# Altium footprint library Conectors.PcbLib: 123 footprints (part 6 of 8)
Each footprint in its own frame and in the unit in brackets; x right, y up, seen from the top. Pads: shape width x height; smd on the part's side, far side on the other; paste and mask are expansions set on the pad; w line width, h text height; cw(c..) or ccw(c..) is an arc to the next point about the centre after c.
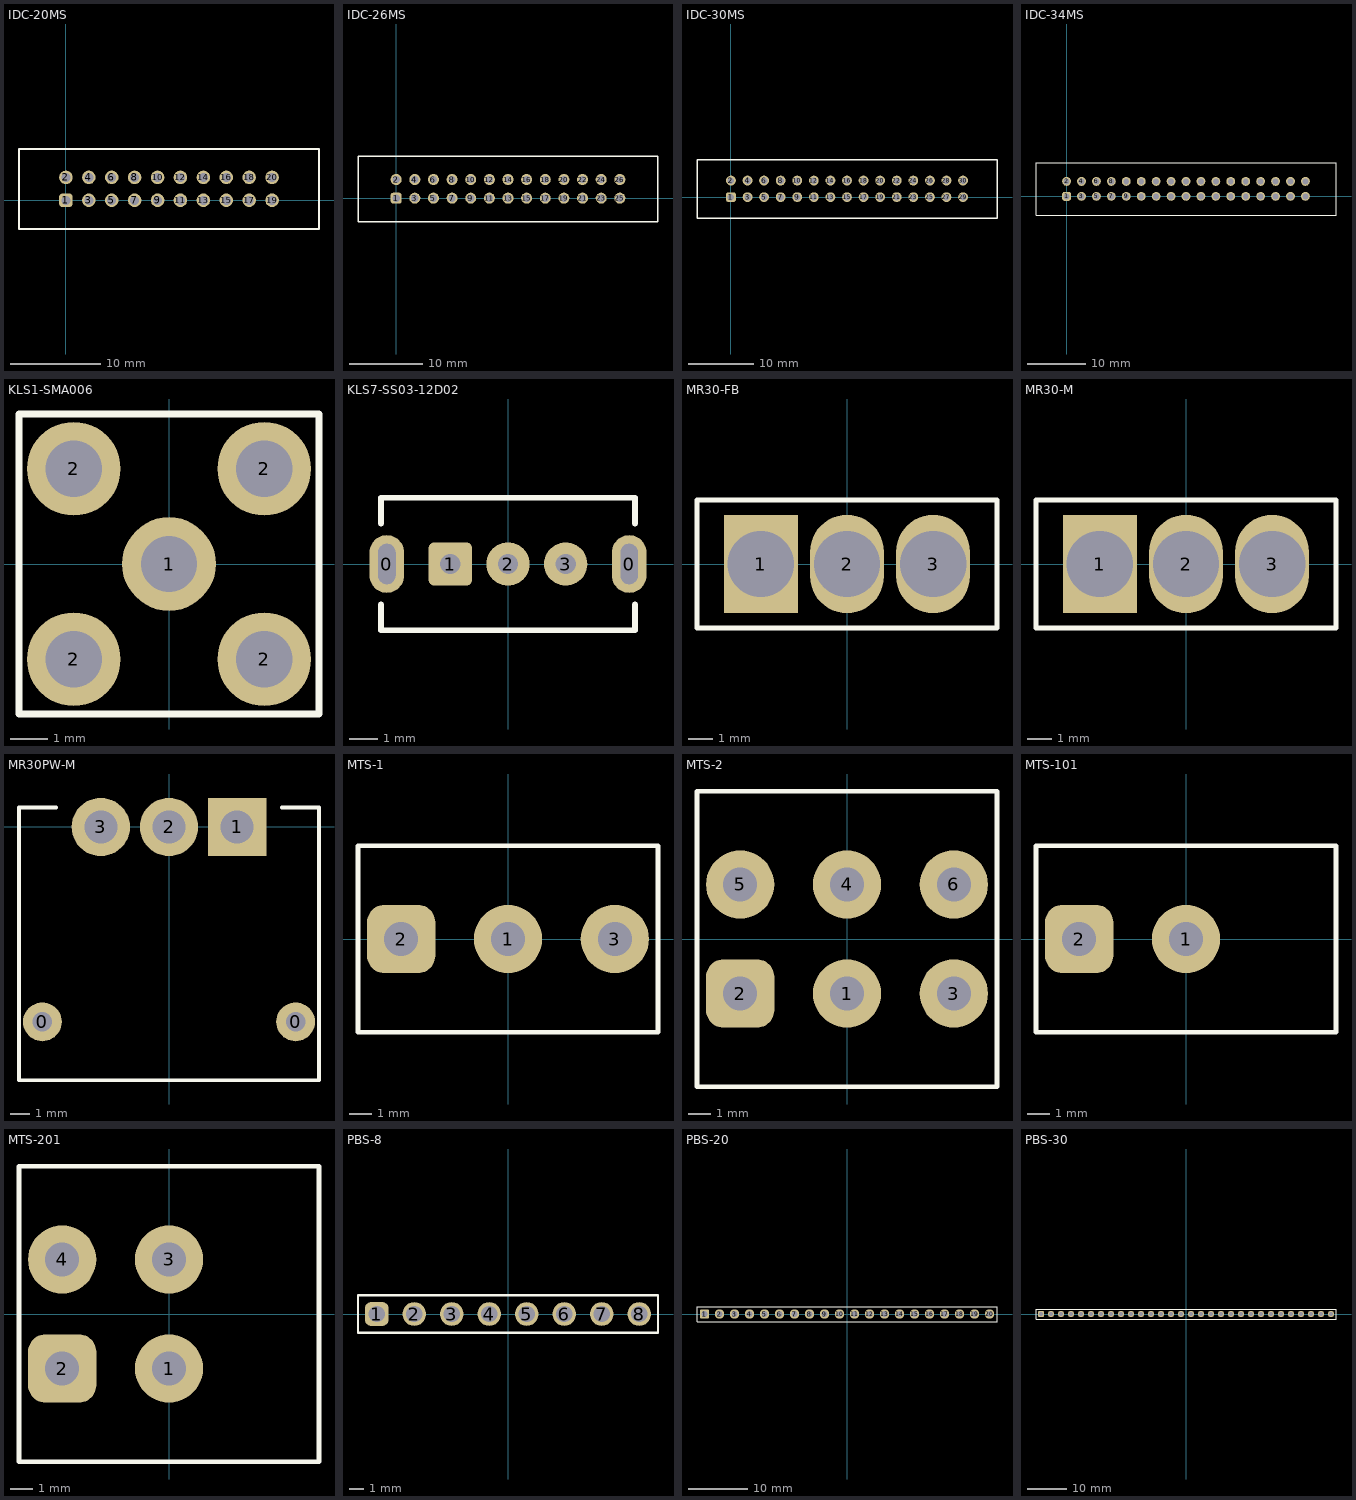
[diagram p5: the footprints below, top view; thin cyan lines are the x and y axes]

## IDC-20MS [mm]
pads (20):
  rrect50% 1.5x1.5 hole 1: 1(0,0)
  round 1.5 hole 1: 2(0,2.54) 3(2.54,0) 4(2.54,2.54) 5(5.08,0) 6(5.08,2.54) 7(7.62,0) 8(7.62,2.54) 9(10.16,0) 10(10.16,2.54) 11(12.7,0) 12(12.7,2.54) 13(15.24,0) 14(15.24,2.54) 15(17.78,0) 16(17.78,2.54) 17(20.32,0) 18(20.32,2.54) 19(22.86,0) 20(22.86,2.54)
Top Overlay:
  lines w0.2: -5.2,-3.2 28.06,-3.2 28.06,5.7 -5.2,5.7 -5.2,-3.2
3D body "DS1013-20S (IDC-20MS CONNFLY).stp": height 9, standoff -3.6, extent -5.17,-3.23 28.03,5.67

## IDC-26MS [mm]
pads (26):
  rrect50% 1.5x1.5 hole 1: 1(0,0)
  round 1.5 hole 1: 2(0,2.54) 3(2.54,0) 4(2.54,2.54) 5(5.08,0) 6(5.08,2.54) 7(7.62,0) 8(7.62,2.54) 9(10.16,0) 10(10.16,2.54) 11(12.7,0) 12(12.7,2.54) 13(15.24,0) 14(15.24,2.54) 15(17.78,0) 16(17.78,2.54) 17(20.32,0) 18(20.32,2.54) 19(22.86,0) 20(22.86,2.54) 21(25.4,0) 22(25.4,2.54) 23(27.94,0) 24(27.94,2.54) 25(30.48,0) 26(30.48,2.54)
Top Overlay:
  lines w0.2: -5.2,-3.2 -5.2,5.7 35.68,5.7 35.68,-3.2 -5.2,-3.2
3D body "DS1013-26S (IDC-26MS CONNFLY).stp": height 9, standoff -3.6, extent -5.17,-3.23 35.65,5.67

## IDC-30MS [mm]
pads (30):
  rrect50% 1.5x1.5 hole 1: 1(0,0)
  round 1.5 hole 1: 2(0,2.54) 3(2.54,0) 4(2.54,2.54) 5(5.08,0) 6(5.08,2.54) 7(7.62,0) 8(7.62,2.54) 9(10.16,0) 10(10.16,2.54) 11(12.7,0) 12(12.7,2.54) 13(15.24,0) 14(15.24,2.54) 15(17.78,0) 16(17.78,2.54) 17(20.32,0) 18(20.32,2.54) 19(22.86,0) 20(22.86,2.54) 21(25.4,0) 22(25.4,2.54) 23(27.94,0) 24(27.94,2.54) 25(30.48,0) 26(30.48,2.54) 27(33.02,0) 28(33.02,2.54) 29(35.56,0) 30(35.56,2.54)
Top Overlay:
  lines w0.2: -5.2,-3.2 40.76,-3.2 40.76,5.7 -5.2,5.7 -5.2,-3.2
3D body "DS1013-30S (IDC-30MS CONNFLY).step": height 9, standoff -3.6, extent -5.17,-3.23 40.73,5.67

## IDC-34MS [mm]
pads (34):
  rrect50% 1.5x1.5 hole 1: 1(0,0)
  round 1.5 hole 1: 2(0,2.54) 3(2.54,0) 4(2.54,2.54) 5(5.08,0) 6(5.08,2.54) 7(7.62,0) 8(7.62,2.54) 9(10.16,0) 10(10.16,2.54) 11(12.7,0) 12(12.7,2.54) 13(15.24,0) 14(15.24,2.54) 15(17.78,0) 16(17.78,2.54) 17(20.32,0) 18(20.32,2.54) 19(22.86,0) 20(22.86,2.54) 21(25.4,0) 22(25.4,2.54) 23(27.94,0) 24(27.94,2.54) 25(30.48,0) 26(30.48,2.54) 27(33.02,0) 28(33.02,2.54) 29(35.56,0) 30(35.56,2.54) 31(38.1,0) 32(38.1,2.54) 33(40.64,0) 34(40.64,2.54)
Top Overlay:
  lines w0.2: -5.2,-3.2 -5.2,5.7 45.84,5.7 45.84,-3.2 -5.2,-3.2
3D body "DS1013-34S (IDC-34MS CONNFLY).step": height 9, standoff -3.6, extent -5.17,-3.23 45.81,5.67

## KLS1-SMA006 [mm]
pads (5):
  round 2.5 hole 1.5: 1(0,0) 2(-2.54,-2.54) 2(-2.54,2.54) 2(2.54,-2.54) 2(2.54,2.54)
Top Overlay:
  lines w0.2: -4,-4 4,-4 4,4 -4,4 -4,-4
3D body "KLS1-SMA006.STEP": height 10.5, standoff -3, extent -3.5,-13.5 3.5,3.5

## KLS7-SS03-12D02 [mm]
pads (5):
  oval 1.2x2 hole 0.6 slot 1.4 at 90 deg: 0(-4.2,0) 0(4.2,0)
  rrect25% 1.5x1.5 hole 0.7: 1(-2,0)
  round 1.5 hole 0.7: 2(0,0) 3(2,0)
Top Overlay:
  lines w0.2: -4.4,-1.4 -4.4,-2.3 4.4,-2.3 4.4,-1.4 ; -4.4,1.4 -4.4,2.3 4.4,2.3 4.4,1.4
3D body "User Library-KLS7-SS03-12D02-EG-3.step": height 7.33, standoff -2.8, extent -4.35,-2.25 4.35,2.25

## MR30-FB [mm]
pads (3):
  rect 3x4 hole 2.7: 1(-3.5,0)
  oval 3x4 hole 2.7: 2(0,0) 3(3.5,0)
Top Overlay:
  lines w0.2: -6.1,-2.6 -6.1,2.6 6.1,2.6 6.1,-2.6 -6.1,-2.6
3D body "Amass MR30-FB.STEP": height 9.5, standoff -3, extent -6.1,-2.6 6.1,2.6

## MR30-M [mm]
pads (3):
  rect 3x4 hole 2.7: 1(-3.5,0)
  oval 3x4 hole 2.7: 2(0,0) 3(3.5,0)
Top Overlay:
  lines w0.2: -6.1,-2.6 -6.1,2.6 6.1,2.6 6.1,-2.6 -6.1,-2.6
3D body "Amass MR30-M.STEP": height 10.5, standoff -3, extent -6.05,-2.55 6.05,2.55

## MR30PW-M [mm]
pads (5):
  round 2 hole 1: 0(-6.5,-10) 0(6.5,-10)
  rect 3x3 hole 1.7: 1(3.5,0)
  round 3 hole 1.7: 2(0,0) 3(-3.5,0)
Top Overlay:
  lines w0.2: -5.8,1 -7.7,1 -7.7,-13 7.7,-13 7.7,1 5.8,1
3D body "MR30PW-M v2.step": height 5.05, standoff -1.95, extent -7.7,-13 7.7,0.95

## MTS-1 [mm]
pads (3):
  round 3 hole 1.5: 1(0,0) 3(4.7,0)
  rrect50% 3x3 hole 1.5: 2(-4.7,0)
Top Overlay:
  lines w0.2: -6.6,-4.103 -6.6,4.1 6.6,4.103 6.6,-4.1 -6.6,-4.103
3D body "MTS-1xx-A2-blue.step": height 30.13, standoff -5.5, extent -6.792,-5.999 6.6,5.999

## MTS-2 [mm]
pads (6):
  round 3 hole 1.5: 1(0,-2.4) 3(4.7,-2.4) 4(0,2.4) 5(-4.7,2.4) 6(4.7,2.4)
  rrect50% 3x3 hole 1.5: 2(-4.7,-2.4)
Top Overlay:
  lines w0.2: -6.6,-6.503 -6.6,6.5 6.6,6.503 6.6,-6.5 -6.6,-6.503
3D body "ToggleSwitch 6Pin.stp": height 29.31, standoff -3.5, extent -8,-6.4 6.55,6.4

## MTS-101 [mm]
pads (2):
  round 3 hole 1.5: 1(0,0)
  rrect50% 3x3 hole 1.5: 2(-4.7,0)
Top Overlay:
  lines w0.2: -6.6,-4.103 -6.6,4.1 6.6,4.103 6.6,-4.1 -6.6,-4.103
3D body "MTS-1xx-A2-blue.step": height 30.13, standoff -5.5, extent -6.792,-5.999 6.6,5.999

## MTS-201 [mm]
pads (4):
  round 3 hole 1.5: 1(0,-2.4) 3(0,2.4) 4(-4.7,2.4)
  rrect50% 3x3 hole 1.5: 2(-4.7,-2.4)
Top Overlay:
  lines w0.2: -6.6,-6.503 6.6,-6.5 6.6,6.503 -6.6,6.5 -6.6,-6.503
3D body "ToggleSwitch 6Pin.stp": height 29.31, standoff -3.5, extent -8,-6.4 6.55,6.4

## PBS-8 [mm]
pads (8):
  rrect50% 1.6x1.6 hole 1.1: 1(-8.89,0)
  round 1.6 hole 1.1: 2(-6.35,0) 3(-3.81,0) 4(-1.27,0) 5(1.27,0) 6(3.81,0) 7(6.35,0) 8(8.89,0)
Top Overlay:
  lines w0.15: -10.16,-1.27 -10.16,1.27 0,1.27 10.16,1.27 10.16,-1.27 0,-1.27 -10.16,-1.27
3D body "User Library-DS1023.STEP": height 8.5, standoff -3, extent -10.16,-1.27 -7.62,1.27
3D body "User Library-DS1023.STEP": height 8.5, standoff -3, extent -7.62,-1.27 -5.08,1.27
3D body "User Library-DS1023.STEP": height 8.5, standoff -3, extent -5.08,-1.27 -2.54,1.27
3D body "User Library-DS1023.STEP": height 8.5, standoff -3, extent -2.54,-1.27 0,1.27
3D body "User Library-DS1023.STEP": height 8.5, standoff -3, extent 0,-1.27 2.54,1.27
3D body "User Library-DS1023.STEP": height 8.5, standoff -3, extent 2.54,-1.27 5.08,1.27
3D body "User Library-DS1023.STEP": height 8.5, standoff -3, extent 5.08,-1.27 7.62,1.27
3D body "User Library-DS1023.STEP": height 8.5, standoff -3, extent 7.62,-1.27 10.16,1.27

## PBS-20 [mm]
pads (20):
  rrect50% 1.6x1.6 hole 1.1: 1(-24.13,0)
  round 1.6 hole 1.1: 2(-21.59,0) 3(-19.05,0) 4(-16.51,0) 5(-13.97,0) 6(-11.43,0) 7(-8.89,0) 8(-6.35,0) 9(-3.81,0) 10(-1.27,0) 11(1.27,0) 12(3.81,0) 13(6.35,0) 14(8.89,0) 15(11.43,0) 16(13.97,0) 17(16.51,0) 18(19.05,0) 19(21.59,0) 20(24.13,0)
Top Overlay:
  lines w0.15: -25.4,-1.27 25.4,-1.27 25.4,1.27 -25.4,1.27 -25.4,-1.27
3D body "User Library-DS1023.STEP": height 8.5, standoff -3, extent -7.62,-1.27 -5.08,1.27
3D body "User Library-DS1023.STEP": height 8.5, standoff -3, extent -10.16,-1.27 -7.62,1.27
3D body "User Library-DS1023.STEP": height 8.5, standoff -3, extent -12.7,-1.27 -10.16,1.27
3D body "User Library-DS1023.STEP": height 8.5, standoff -3, extent -15.24,-1.27 -12.7,1.27
3D body "User Library-DS1023.STEP": height 8.5, standoff -3, extent -17.78,-1.27 -15.24,1.27
3D body "User Library-DS1023.STEP": height 8.5, standoff -3, extent -20.32,-1.27 -17.78,1.27
3D body "User Library-DS1023.STEP": height 8.5, standoff -3, extent -22.86,-1.27 -20.32,1.27
3D body "User Library-DS1023.STEP": height 8.5, standoff -3, extent -25.4,-1.27 -22.86,1.27
3D body "User Library-DS1023.STEP": height 8.5, standoff -3, extent -2.54,-1.27 0,1.27
3D body "User Library-DS1023.STEP": height 8.5, standoff -3, extent -5.08,-1.27 -2.54,1.27
3D body "User Library-DS1023.STEP": height 8.5, standoff -3, extent 5.08,-1.27 7.62,1.27
3D body "User Library-DS1023.STEP": height 8.5, standoff -3, extent 7.62,-1.27 10.16,1.27
3D body "User Library-DS1023.STEP": height 8.5, standoff -3, extent 10.16,-1.27 12.7,1.27
3D body "User Library-DS1023.STEP": height 8.5, standoff -3, extent 12.7,-1.27 15.24,1.27
3D body "User Library-DS1023.STEP": height 8.5, standoff -3, extent 15.24,-1.27 17.78,1.27
3D body "User Library-DS1023.STEP": height 8.5, standoff -3, extent 17.78,-1.27 20.32,1.27
3D body "User Library-DS1023.STEP": height 8.5, standoff -3, extent 20.32,-1.27 22.86,1.27
3D body "User Library-DS1023.STEP": height 8.5, standoff -3, extent 22.86,-1.27 25.4,1.27
3D body "User Library-DS1023.STEP": height 8.5, standoff -3, extent 0,-1.27 2.54,1.27
3D body "User Library-DS1023.STEP": height 8.5, standoff -3, extent 2.54,-1.27 5.08,1.27

## PBS-30 [mm]
pads (30):
  rrect50% 1.6x1.6 hole 1.1: 1(-36.83,0)
  round 1.6 hole 1.1: 2(-34.29,0) 3(-31.75,0) 4(-29.21,0) 5(-26.67,0) 6(-24.13,0) 7(-21.59,0) 8(-19.05,0) 9(-16.51,0) 10(-13.97,0) 11(-11.43,0) 12(-8.89,0) 13(-6.35,0) 14(-3.81,0) 15(-1.27,0) 16(1.27,0) 17(3.81,0) 18(6.35,0) 19(8.89,0) 20(11.43,0) 21(13.97,0) 22(16.51,0) 23(19.05,0) 24(21.59,0) 25(24.13,0) 26(26.67,0) 27(29.21,0) 28(31.75,0) 29(34.29,0) 30(36.83,0)
Top Overlay:
  lines w0.15: -38.1,-1.27 -38.1,1.27 0,1.27 38.1,1.27 38.1,-1.27 0,-1.27 -38.1,-1.27
3D body "User Library-DS1023.STEP": height 8.5, standoff -3, extent -10.16,-1.27 -7.62,1.27
3D body "User Library-DS1023.STEP": height 8.5, standoff -3, extent -12.7,-1.27 -10.16,1.27
3D body "User Library-DS1023.STEP": height 8.5, standoff -3, extent 10.16,-1.27 12.7,1.27
3D body "User Library-DS1023.STEP": height 8.5, standoff -3, extent 7.62,-1.27 10.16,1.27
3D body "User Library-DS1023.STEP": height 8.5, standoff -3, extent 5.08,-1.27 7.62,1.27
3D body "User Library-DS1023.STEP": height 8.5, standoff -3, extent 2.54,-1.27 5.08,1.27
3D body "User Library-DS1023.STEP": height 8.5, standoff -3, extent 0,-1.27 2.54,1.27
3D body "User Library-DS1023.STEP": height 8.5, standoff -3, extent -2.54,-1.27 0,1.27
3D body "User Library-DS1023.STEP": height 8.5, standoff -3, extent -5.08,-1.27 -2.54,1.27
3D body "User Library-DS1023.STEP": height 8.5, standoff -3, extent -7.62,-1.27 -5.08,1.27
3D body "User Library-DS1023.STEP": height 8.5, standoff -3, extent -17.78,-1.27 -15.24,1.27
3D body "User Library-DS1023.STEP": height 8.5, standoff -3, extent -15.24,-1.27 -12.7,1.27
3D body "User Library-DS1023.STEP": height 8.5, standoff -3, extent -38.1,-1.27 -35.56,1.27
3D body "User Library-DS1023.STEP": height 8.5, standoff -3, extent -35.56,-1.27 -33.02,1.27
3D body "User Library-DS1023.STEP": height 8.5, standoff -3, extent -33.02,-1.27 -30.48,1.27
3D body "User Library-DS1023.STEP": height 8.5, standoff -3, extent -30.48,-1.27 -27.94,1.27
3D body "User Library-DS1023.STEP": height 8.5, standoff -3, extent -27.94,-1.27 -25.4,1.27
3D body "User Library-DS1023.STEP": height 8.5, standoff -3, extent -25.4,-1.27 -22.86,1.27
3D body "User Library-DS1023.STEP": height 8.5, standoff -3, extent -22.86,-1.27 -20.32,1.27
3D body "User Library-DS1023.STEP": height 8.5, standoff -3, extent -20.32,-1.27 -17.78,1.27
3D body "User Library-DS1023.STEP": height 8.5, standoff -3, extent 33.02,-1.27 35.56,1.27
3D body "User Library-DS1023.STEP": height 8.5, standoff -3, extent 35.56,-1.27 38.1,1.27
3D body "User Library-DS1023.STEP": height 8.5, standoff -3, extent 12.7,-1.27 15.24,1.27
3D body "User Library-DS1023.STEP": height 8.5, standoff -3, extent 15.24,-1.27 17.78,1.27
3D body "User Library-DS1023.STEP": height 8.5, standoff -3, extent 17.78,-1.27 20.32,1.27
3D body "User Library-DS1023.STEP": height 8.5, standoff -3, extent 20.32,-1.27 22.86,1.27
3D body "User Library-DS1023.STEP": height 8.5, standoff -3, extent 22.86,-1.27 25.4,1.27
3D body "User Library-DS1023.STEP": height 8.5, standoff -3, extent 25.4,-1.27 27.94,1.27
3D body "User Library-DS1023.STEP": height 8.5, standoff -3, extent 27.94,-1.27 30.48,1.27
3D body "User Library-DS1023.STEP": height 8.5, standoff -3, extent 30.48,-1.27 33.02,1.27